# Altium schematic symbol library IC_ADI.SCHLIB: 3169 symbols (part 124 of 181) (continued)
## AD7945ARS-B
designator U?
Single 12-Bit Multiplying Digital-to-Analog Converter, 3.3 V / 5 V, -40 to +85 degC, RS-20, Tube; Generic Part Number: AD7945; PartNumber: AD7945ARS-B; # DAC Outputs: 1; Max V+: 5.5V; Op Pwr Diss: 25礧; Resolution (Bits): 12; Settling Time: 600ns; Single Supply: Yes; DatasheetVersion: Rev.B; PackageVersion: Mar-2003; PackageReference: RS-20; PackageDescription: 20-Lead Shrink Small Outline Package [SSOP]; Supplier Part Number 1: AD7945ARS-B-ND; Supplier Part Number 2: 584-AD7945ARS-B; Packing: Tube; RoHS: N; Mounting Technology: Surface Mount; Code_JEDEC: MO-150AE; ComponentLink1Description: Manufacturer URL; ComponentLink2Description: Datasheet; ComponentLink3Description: Package Specification; ComponentLink4Description: Product URL
footprint SSOP20_0.65 (Footprint not found)
pins: 1 IOUT1 (out) "DAC current output terminal 1.", 2 AGND (power) "This pin connects to the back gates of the current steering switches. The DAC IOUT2 terminal is also connected internally to this point.", 3 DGND (power) "Digital Ground.", 4 DB11 (in) "Digital Data Input.", 5 DB10 (in) "Digital Data Input.", 6 DB9 (in) "Digital Data Input.", 7 DB8 (in) "Digital Data Input.", 8 DB7 (in) "Digital Data Input.", 9 DB6 (in) "Digital Data Input.", 10 DB5 (in) "Digital Data Input.", 11 DB4 (in) "Digital Data Input.", 12 DB3 (in) "Digital Data Input.", 13 DB2 (in) "Digital Data Input.", 14 DB1 (in) "Digital Data Input.", 15 DB0 (in) "Digital Data Input.", 16 ~{CS} (in) "Active Low, Chip Select Input.", 17 ~{WR} (in) "Active Low, Write Input.", 18 VDD (power) "Power supply input. This is nominally +5 V for Normal Mode Operation and +3.3 V to +5 V for Biased Mode Operation.", 19 VREF (in) "DAC reference input.", 20 RFB (in) "DAC feedback resistor pin."

## AD7945ARSZ-B
designator U?
Single 12-Bit Multiplying Digital-to-Analog Converter, 3.3 V / 5 V, 0 to +70 degC, RS-20, Pb-Free, Tube; Generic Part Number: AD7945; PartNumber: AD7945ARSZ-B; # DAC Outputs: 1; Max V+: 5.5V; Op Pwr Diss: 25礧; Resolution (Bits): 12; Settling Time: 600ns; Single Supply: Yes; DatasheetVersion: Rev.B; PackageVersion: Mar-2003; PackageReference: RS-20; PackageDescription: 20-Lead Shrink Small Outline Package [SSOP]; Supplier Part Number 1: AD7945ARSZ-B-ND; Supplier Part Number 2: 584-AD7945ARSZ-B; Packing: Tube; RoHS: Y; Mounting Technology: Surface Mount; Code_JEDEC: MO-150AE; ComponentLink1Description: Manufacturer URL; ComponentLink2Description: Datasheet; ComponentLink3Description: Package Specification; ComponentLink4Description: Product URL
footprint SSOP20_0.65 (Footprint not found)
pins: 1 IOUT1 (out) "DAC current output terminal 1.", 2 AGND (power) "This pin connects to the back gates of the current steering switches. The DAC IOUT2 terminal is also connected internally to this point.", 3 DGND (power) "Digital Ground.", 4 DB11 (in) "Digital Data Input.", 5 DB10 (in) "Digital Data Input.", 6 DB9 (in) "Digital Data Input.", 7 DB8 (in) "Digital Data Input.", 8 DB7 (in) "Digital Data Input.", 9 DB6 (in) "Digital Data Input.", 10 DB5 (in) "Digital Data Input.", 11 DB4 (in) "Digital Data Input.", 12 DB3 (in) "Digital Data Input.", 13 DB2 (in) "Digital Data Input.", 14 DB1 (in) "Digital Data Input.", 15 DB0 (in) "Digital Data Input.", 16 ~{CS} (in) "Active Low, Chip Select Input.", 17 ~{WR} (in) "Active Low, Write Input.", 18 VDD (power) "Power supply input. This is nominally +5 V for Normal Mode Operation and +3.3 V to +5 V for Biased Mode Operation.", 19 VREF (in) "DAC reference input.", 20 RFB (in) "DAC feedback resistor pin."

## AD7945BN
designator U?
Single 12-Bit Multiplying Digital-to-Analog Converter, 3.3 V / 5 V, -40 to +85 degC, N-20, Tube; Generic Part Number: AD7945; PartNumber: AD7945BN; # DAC Outputs: 1; Max V+: 5.5V; Op Pwr Diss: 25礧; Resolution (Bits): 12; Settling Time: 600ns; Single Supply: Yes; DatasheetVersion: Rev.B; PackageVersion: 070706-A; PackageReference: N-20; PackageDescription: 20-Lead Plastic Dual In-Line Package [PDIP] Narrow Body; Supplier Part Number 1: AD7945BN-ND; Supplier Part Number 2: 584-AD7945BN; Packing: Tube; RoHS: N; Mounting Technology: Through Hole; Code_JEDEC: MS-001; ComponentLink1Description: Manufacturer URL; ComponentLink2Description: Datasheet; ComponentLink3Description: Package Specification; ComponentLink4Description: Product URL
footprint DIP20 (Footprint not found)
pins: 1 IOUT1 (out) "DAC current output terminal 1.", 2 AGND (power) "This pin connects to the back gates of the current steering switches. The DAC IOUT2 terminal is also connected internally to this point.", 3 DGND (power) "Digital Ground.", 4 DB11 (in) "Digital Data Input.", 5 DB10 (in) "Digital Data Input.", 6 DB9 (in) "Digital Data Input.", 7 DB8 (in) "Digital Data Input.", 8 DB7 (in) "Digital Data Input.", 9 DB6 (in) "Digital Data Input.", 10 DB5 (in) "Digital Data Input.", 11 DB4 (in) "Digital Data Input.", 12 DB3 (in) "Digital Data Input.", 13 DB2 (in) "Digital Data Input.", 14 DB1 (in) "Digital Data Input.", 15 DB0 (in) "Digital Data Input.", 16 ~{CS} (in) "Active Low, Chip Select Input.", 17 ~{WR} (in) "Active Low, Write Input.", 18 VDD (power) "Power supply input. This is nominally +5 V for Normal Mode Operation and +3.3 V to +5 V for Biased Mode Operation.", 19 VREF (in) "DAC reference input.", 20 RFB (in) "DAC feedback resistor pin."

## AD7945BR
designator U?
Single 12-Bit Multiplying Digital-to-Analog Converter, 3.3 V / 5 V, -40 to +85 degC, RW-20, Tube; Generic Part Number: AD7945; PartNumber: AD7945BR; # DAC Outputs: 1; Max V+: 5.5V; Op Pwr Diss: 25礧; Resolution (Bits): 12; Settling Time: 600ns; Single Supply: Yes; DatasheetVersion: Rev.B; PackageVersion: 060706-A; PackageReference: RW-20; PackageDescription: 20-Lead Standard Small Outline Package [SOIC_W] Wide Body; Supplier Part Number 1: AD7945BR-ND; Supplier Part Number 2: 584-AD7945BR; Packing: Tube; RoHS: N; Mounting Technology: Surface Mount; Code_JEDEC: MS-013-AC; ComponentLink1Description: Manufacturer URL; ComponentLink2Description: Datasheet; ComponentLink3Description: Package Specification; ComponentLink4Description: Product URL
footprint SOIC20W_1.27 (Footprint not found)
pins: 1 IOUT1 (out) "DAC current output terminal 1.", 2 AGND (power) "This pin connects to the back gates of the current steering switches. The DAC IOUT2 terminal is also connected internally to this point.", 3 DGND (power) "Digital Ground.", 4 DB11 (in) "Digital Data Input.", 5 DB10 (in) "Digital Data Input.", 6 DB9 (in) "Digital Data Input.", 7 DB8 (in) "Digital Data Input.", 8 DB7 (in) "Digital Data Input.", 9 DB6 (in) "Digital Data Input.", 10 DB5 (in) "Digital Data Input.", 11 DB4 (in) "Digital Data Input.", 12 DB3 (in) "Digital Data Input.", 13 DB2 (in) "Digital Data Input.", 14 DB1 (in) "Digital Data Input.", 15 DB0 (in) "Digital Data Input.", 16 ~{CS} (in) "Active Low, Chip Select Input.", 17 ~{WR} (in) "Active Low, Write Input.", 18 VDD (power) "Power supply input. This is nominally +5 V for Normal Mode Operation and +3.3 V to +5 V for Biased Mode Operation.", 19 VREF (in) "DAC reference input.", 20 RFB (in) "DAC feedback resistor pin."

## AD7945BRS
designator U?
Single 12-Bit Multiplying Digital-to-Analog Converter, 3.3 V / 5 V, -40 to +85 degC, RS-20, Tube; Generic Part Number: AD7945; PartNumber: AD7945BRS; # DAC Outputs: 1; Max V+: 5.5V; Op Pwr Diss: 25礧; Resolution (Bits): 12; Settling Time: 600ns; Single Supply: Yes; DatasheetVersion: Rev.B; PackageVersion: Mar-2003; PackageReference: RS-20; PackageDescription: 20-Lead Shrink Small Outline Package [SSOP]; Supplier Part Number 1: AD7945BRS-ND; Supplier Part Number 2: 584-AD7945BRS; Packing: Tube; RoHS: N; Mounting Technology: Surface Mount; Code_JEDEC: MO-150AE; ComponentLink1Description: Manufacturer URL; ComponentLink2Description: Datasheet; ComponentLink3Description: Package Specification; ComponentLink4Description: Product URL
footprint SSOP20_0.65 (Footprint not found)
pins: 1 IOUT1 (out) "DAC current output terminal 1.", 2 AGND (power) "This pin connects to the back gates of the current steering switches. The DAC IOUT2 terminal is also connected internally to this point.", 3 DGND (power) "Digital Ground.", 4 DB11 (in) "Digital Data Input.", 5 DB10 (in) "Digital Data Input.", 6 DB9 (in) "Digital Data Input.", 7 DB8 (in) "Digital Data Input.", 8 DB7 (in) "Digital Data Input.", 9 DB6 (in) "Digital Data Input.", 10 DB5 (in) "Digital Data Input.", 11 DB4 (in) "Digital Data Input.", 12 DB3 (in) "Digital Data Input.", 13 DB2 (in) "Digital Data Input.", 14 DB1 (in) "Digital Data Input.", 15 DB0 (in) "Digital Data Input.", 16 ~{CS} (in) "Active Low, Chip Select Input.", 17 ~{WR} (in) "Active Low, Write Input.", 18 VDD (power) "Power supply input. This is nominally +5 V for Normal Mode Operation and +3.3 V to +5 V for Biased Mode Operation.", 19 VREF (in) "DAC reference input.", 20 RFB (in) "DAC feedback resistor pin."

## AD7945BRSZ
designator U?
Single 12-Bit Multiplying Digital-to-Analog Converter, 3.3 V / 5 V, 0 to +70 degC, RS-20, Pb-Free, Tube; Generic Part Number: AD7945; PartNumber: AD7945BRSZ; # DAC Outputs: 1; Max V+: 5.5V; Op Pwr Diss: 25礧; Resolution (Bits): 12; Settling Time: 600ns; Single Supply: Yes; DatasheetVersion: Rev.B; PackageVersion: Mar-2003; PackageReference: RS-20; PackageDescription: 20-Lead Shrink Small Outline Package [SSOP]; Supplier Part Number 1: AD7945BRSZ-ND; Supplier Part Number 2: 2305692; Supplier Part Number 3: 59K6071; Supplier Part Number 4: 584-AD7945BRSZ; Packing: Tube; RoHS: Y; Mounting Technology: Surface Mount; Code_JEDEC: MO-150AE; ComponentLink1Description: Manufacturer URL; ComponentLink2Description: Datasheet; ComponentLink3Description: Package Specification; ComponentLink4Description: Product URL
footprint SSOP20_0.65 (Footprint not found)
pins: 1 IOUT1 (out) "DAC current output terminal 1.", 2 AGND (power) "This pin connects to the back gates of the current steering switches. The DAC IOUT2 terminal is also connected internally to this point.", 3 DGND (power) "Digital Ground.", 4 DB11 (in) "Digital Data Input.", 5 DB10 (in) "Digital Data Input.", 6 DB9 (in) "Digital Data Input.", 7 DB8 (in) "Digital Data Input.", 8 DB7 (in) "Digital Data Input.", 9 DB6 (in) "Digital Data Input.", 10 DB5 (in) "Digital Data Input.", 11 DB4 (in) "Digital Data Input.", 12 DB3 (in) "Digital Data Input.", 13 DB2 (in) "Digital Data Input.", 14 DB1 (in) "Digital Data Input.", 15 DB0 (in) "Digital Data Input.", 16 ~{CS} (in) "Active Low, Chip Select Input.", 17 ~{WR} (in) "Active Low, Write Input.", 18 VDD (power) "Power supply input. This is nominally +5 V for Normal Mode Operation and +3.3 V to +5 V for Biased Mode Operation.", 19 VREF (in) "DAC reference input.", 20 RFB (in) "DAC feedback resistor pin."

## AD7946BRMZ
designator U?
Single 14-Bit PulSAR Analog-to-Digital Converter with Serial, SPI Interface, 500KSPS, -40 to +85 degC, RM-10, Pb-Free, Tube; Generic Part Number: AD7946; PartNumber: AD7946BRMZ; Resolution (Bits): 14; Channels: 1; Throughput Rate (SPS): 500K; Interface: Ser, SPI; DatasheetVersion: Rev.A; PackageVersion: May-2005; PackageReference: RM-10; PackageDescription: 10-Lead Mini Small Outline Package [MSOP]; Supplier Part Number 1: AD7946BRMZ-ND; Supplier Part Number 2: 1438865; Supplier Part Number 3: 15P0902; Supplier Part Number 4: 584-AD7946BRMZ; RoHS: Y; Packing: Tube; Mounting Technology: Surface Mount; ComponentLink1Description: Manufacturer URL; ComponentLink2Description: Datasheet; ComponentLink3Description: Package Specification; ComponentLink4Description: Product URL
footprint VSSOP10_0.5 (Footprint not found)
pins: 1 REF (in) "Reference Input Voltage. The REF range is from 0.5 V to VDD, and is referred to the GND pin. This pin should be decoupled closely to the pin with a 10 uF capacitor.", 2 VDD (power) "Power Supply.", 3 IN+ (in) "Analog Input. It is referred to IN-. The voltage range, that is, the difference between IN+ and IN-, is 0 V to REF.", 4 IN- (in) "Analog Input Ground Sense. Connect to the analog ground plane or to a remote sense ground.", 5 GND (power) "Power Supply Ground.", 6 CNV (in) "Convert Input. This input has multiple functions. On its leading edge, it initiates the conversions and selects the interface mode, chain, or C\S\. In C\S\ mode, it enables the SDO pin when low. In chain mode, the data (See Datasheet)", 7 SDO (hiz) "Serial Data Output. The conversion result is output on this pin. It is synchronized to SCK.", 8 SCK (in) "Serial Data Clock Input. When the part is selected, the conversion result is shifted out by this clock.", 9 SDI (in) "Serial Data Input. This input provides multiple features. It selects the interface mode of the ADC as follows: Chain mode is selected if SDI is low during the CNV rising edge. In this mode, SDI is used as a data input to (See Datasheet)", 10 VIO (power) "Input/Output Interface Digital Power. Nominally at the same supply as the host interface (1.8 V, 2.5 V, 3 V, or 5 V)."

## AD7948ARSZ-B
designator U?
Single 12-Bit Multiplying Digital-to-Analog Converter, 3.3 V / 5 V, -40 to +85 degC, RS-20, Pb-Free, Tube; Generic Part Number: AD7948; PartNumber: AD7948ARSZ-B; # DAC Outputs: 1; Max V+: 5.5V; Op Pwr Diss: 25礧; Resolution (Bits): 12; Settling Time: 600ns; Single Supply: Yes; DatasheetVersion: Rev.B; PackageVersion: Mar-2003; PackageReference: RS-20; PackageDescription: 20-Lead Shrink Small Outline Package [SSOP]; Supplier Part Number 1: AD7948ARSZ-B-ND; Supplier Part Number 2: 584-AD7948ARSZ-B; Packing: Tube; RoHS: Y; Mounting Technology: Surface Mount; Code_JEDEC: MO-150AE; ComponentLink1Description: Manufacturer URL; ComponentLink2Description: Datasheet; ComponentLink3Description: Package Specification; ComponentLink4Description: Product URL
footprint SSOP20_0.65 (Footprint not found)
pins: 1 IOUT1 (out) "DAC current output terminal 1. Normally terminated at the virtual ground of output amplifier.", 2 AGND (power) "Analog Ground Pin. This pin connects to the back gates of the current steering switches. The DAC IOUT2 terminal is also connected internally to this point.", 3 DGND (power) "Digital Ground Pin.", 4 ~{CSMSB} (in) "Chip Select Most Significant Byte. Active Low Input. Used in combination with W\R\ to load external data into the input register or in combination with L\D\A\C\ and W\R\ to load external data into both input and DAC (See Datasheet)", 5 DF/~{DOR} (in) "Data Format/Data Override. When this input is low, data in the DAC register is forced to one of two override codes selected by CTRL. When the override signal is removed, the DAC output returns to reflect the value in the DAC (See Datasheet)", 6 CTRL (in) "Control Input. See DF/D\O\R\ description.", 7 DB7 (MSB) (in) "Digital Data Input", 8 DB6 (in) "Digital Data Input", 9 DB5 (in) "Digital Data Input", 10 DB4 (in) "Digital Data Input", 11 DB3 (in) "Digital Data Input", 12 DB2 (in) "Digital Data Input", 13 DB1 (in) "Digital Data Input", 14 DB0 (LSB) (in) "Digital Data Input", 15 ~{LDAC} (in) "Load DAC input, active low. This signal, in combination with others, is used to load the DAC register from either the input register or the external data bus.", 16 ~{CSLSB} (in) "Chip Select Least Significant (LS) Byte. Active Low Input. Used in combination with W\R\ to load external data into the input register or in combination with W\R\ and L\D\A\C\ to load external data into both input and DAC (See Datasheet)", 17 ~{WR} (in) "Write input, active low. This active low signal, in combination with others is used in loading external data into the AD7948 input register and in transferring data from the input register to the DAC register.", 18 VDD (power) "Power supply input. This is nominally +5 V for Normal Mode Operation and +3.3 V to +5 V for Biased Mode Operation.", 19 VREF (in) "DAC reference input.", 20 RFB (in) "DAC feedback resistor pin."

## AD7948BN
designator U?
Single 12-Bit Multiplying Digital-to-Analog Converter, 3.3 V / 5 V, -40 to +85 degC, N-20, Tube; Generic Part Number: AD7948; PartNumber: AD7948BN; # DAC Outputs: 1; Max V+: 5.5V; Op Pwr Diss: 25礧; Resolution (Bits): 12; Settling Time: 600ns; Single Supply: Yes; DatasheetVersion: Rev.B; PackageVersion: 070706-A; PackageReference: N-20; PackageDescription: 20-Lead Plastic Dual In-Line Package [PDIP] Narrow Body; Supplier Part Number 1: AD7948BN-ND; Supplier Part Number 2: 584-AD7948BN; Packing: Tube; RoHS: N; Mounting Technology: Through Hole; Code_JEDEC: MS-001; ComponentLink1Description: Manufacturer URL; ComponentLink2Description: Datasheet; ComponentLink3Description: Package Specification; ComponentLink4Description: Product URL
footprint DIP20 (Footprint not found)
pins: 1 IOUT1 (out) "DAC current output terminal 1. Normally terminated at the virtual ground of output amplifier.", 2 AGND (power) "Analog Ground Pin. This pin connects to the back gates of the current steering switches. The DAC IOUT2 terminal is also connected internally to this point.", 3 DGND (power) "Digital Ground Pin.", 4 ~{CSMSB} (in) "Chip Select Most Significant Byte. Active Low Input. Used in combination with W\R\ to load external data into the input register or in combination with L\D\A\C\ and W\R\ to load external data into both input and DAC (See Datasheet)", 5 DF/~{DOR} (in) "Data Format/Data Override. When this input is low, data in the DAC register is forced to one of two override codes selected by CTRL. When the override signal is removed, the DAC output returns to reflect the value in the DAC (See Datasheet)", 6 CTRL (in) "Control Input. See DF/D\O\R\ description.", 7 DB7 (MSB) (in) "Digital Data Input", 8 DB6 (in) "Digital Data Input", 9 DB5 (in) "Digital Data Input", 10 DB4 (in) "Digital Data Input", 11 DB3 (in) "Digital Data Input", 12 DB2 (in) "Digital Data Input", 13 DB1 (in) "Digital Data Input", 14 DB0 (LSB) (in) "Digital Data Input", 15 ~{LDAC} (in) "Load DAC input, active low. This signal, in combination with others, is used to load the DAC register from either the input register or the external data bus.", 16 ~{CSLSB} (in) "Chip Select Least Significant (LS) Byte. Active Low Input. Used in combination with W\R\ to load external data into the input register or in combination with W\R\ and L\D\A\C\ to load external data into both input and DAC (See Datasheet)", 17 ~{WR} (in) "Write input, active low. This active low signal, in combination with others is used in loading external data into the AD7948 input register and in transferring data from the input register to the DAC register.", 18 VDD (power) "Power supply input. This is nominally +5 V for Normal Mode Operation and +3.3 V to +5 V for Biased Mode Operation.", 19 VREF (in) "DAC reference input.", 20 RFB (in) "DAC feedback resistor pin."

## AD7948BRSZ
designator U?
Single 12-Bit Multiplying Digital-to-Analog Converter, 3.3 V / 5 V, -40 to +85 degC, RS-20, Pb-Free, Tube; Generic Part Number: AD7948; PartNumber: AD7948BRSZ; # DAC Outputs: 1; Max V+: 5.5V; Op Pwr Diss: 25礧; Resolution (Bits): 12; Settling Time: 600ns; Single Supply: Yes; DatasheetVersion: Rev.B; PackageVersion: Mar-2003; PackageReference: RS-20; PackageDescription: 20-Lead Shrink Small Outline Package [SSOP]; Supplier Part Number 1: AD7948BRSZ-ND; Supplier Part Number 2: 584-AD7948BRSZ; Packing: Tube; RoHS: Y; Mounting Technology: Surface Mount; Code_JEDEC: MO-150AE; ComponentLink1Description: Manufacturer URL; ComponentLink2Description: Datasheet; ComponentLink3Description: Package Specification; ComponentLink4Description: Product URL
footprint SSOP20_0.65 (Footprint not found)
pins: 1 IOUT1 (out) "DAC current output terminal 1. Normally terminated at the virtual ground of output amplifier.", 2 AGND (power) "Analog Ground Pin. This pin connects to the back gates of the current steering switches. The DAC IOUT2 terminal is also connected internally to this point.", 3 DGND (power) "Digital Ground Pin.", 4 ~{CSMSB} (in) "Chip Select Most Significant Byte. Active Low Input. Used in combination with W\R\ to load external data into the input register or in combination with L\D\A\C\ and W\R\ to load external data into both input and DAC (See Datasheet)", 5 DF/~{DOR} (in) "Data Format/Data Override. When this input is low, data in the DAC register is forced to one of two override codes selected by CTRL. When the override signal is removed, the DAC output returns to reflect the value in the DAC (See Datasheet)", 6 CTRL (in) "Control Input. See DF/D\O\R\ description.", 7 DB7 (MSB) (in) "Digital Data Input", 8 DB6 (in) "Digital Data Input", 9 DB5 (in) "Digital Data Input", 10 DB4 (in) "Digital Data Input", 11 DB3 (in) "Digital Data Input", 12 DB2 (in) "Digital Data Input", 13 DB1 (in) "Digital Data Input", 14 DB0 (LSB) (in) "Digital Data Input", 15 ~{LDAC} (in) "Load DAC input, active low. This signal, in combination with others, is used to load the DAC register from either the input register or the external data bus.", 16 ~{CSLSB} (in) "Chip Select Least Significant (LS) Byte. Active Low Input. Used in combination with W\R\ to load external data into the input register or in combination with W\R\ and L\D\A\C\ to load external data into both input and DAC (See Datasheet)", 17 ~{WR} (in) "Write input, active low. This active low signal, in combination with others is used in loading external data into the AD7948 input register and in transferring data from the input register to the DAC register.", 18 VDD (power) "Power supply input. This is nominally +5 V for Normal Mode Operation and +3.3 V to +5 V for Biased Mode Operation.", 19 VREF (in) "DAC reference input.", 20 RFB (in) "DAC feedback resistor pin."

## AD7949BCPZ
designator U?
Octal 14-Bit PulSAR Analog-to-Digital Converter with Serial, SPI Interface, 250KSPS, -40 to +85 degC, CP-20-4, Pb-Free, Tray; Generic Part Number: AD7949; PartNumber: AD7949BCPZ; Resolution (Bits): 14; Channels: 8; Throughput Rate (SPS): 250K; Interface: Ser, SPI; DatasheetVersion: Rev.D; PackageVersion: 012508-B; PackageReference: CP-20-4; PackageDescription: 20-Lead Lead Frame Chip Scale Package [LFCSP_VQ] 4 x 4 mm Body, Very Thin Quad; Supplier Part Number 1: AD7949BCPZ-ND; Supplier Part Number 2: 2102529; Supplier Part Number 3: 11N8865; Supplier Part Number 4: 584-AD7949BCPZ; RoHS: Y; Packing: Tray; Mounting Technology: Surface Mount; Code_JEDEC: MO-220-VGGD-1; ComponentLink1Description: Manufacturer URL; ComponentLink2Description: Datasheet; ComponentLink3Description: Package Specification; ComponentLink4Description: Product URL
footprint QFN20_0.5-PAD(4X4) (Footprint not found)
pins: 1 VDD (power) "Power Supply. Nominally 2.5 V to 5.5 V when using an external reference and decoupled with 10 uF and 100 nF capacitors.When using the internal reference for 2.5 V output, the minimum should be 3.0 V.When using the internal (See Datasheet)", 2 REF (io) "Reference Input/Output. See the Voltage Reference Output/Input section. When the internal reference is enabled, this pin produces a selectable system reference = 2.5 V or 4.096 V. When the internal reference is disabled and (See Datasheet)", 3 REFIN (io) "Internal Reference Output/Reference Buffer Input. See the Voltage Reference Output/Input section.When using the internal reference, the internal unbuffered reference voltage is present and needs decoupling with a 0.1 uF (See Datasheet)", 4 GND (power) "Power Supply Ground.", 5 GND (power) "Power Supply Ground.", 6 IN4 (in) "Channel 4 Analog Inputs.", 7 IN5 (in) "Channel 5 Analog Inputs.", 8 IN6 (in) "Channel 6 Analog Inputs.", 9 IN7 (in) "Channel 7 Analog Inputs.", 10 COM (in) "Common Channel Input. All input channels, IN[7:0], can be referenced to a common-mode point of 0 V or VREF/2 V.", 11 CNV (in) "Convert Input. On the rising edge, CNV initiates the conversion. During conversion, if CNV is held high, the busy indictor is enabled.", 12 DIN (in) "Data Input. This input is used for writing to the 14-bit configuration register. The configuration register can be written to during and after conversion.", 13 SCK (in) "Serial Data Clock Input. This input is used to clock out the data on SDO and clock in data on DIN in an MSB first fashion.", 14 SDO (hiz) "Serial Data Output. The conversion result is output on this pin, synchronized to SCK. In unipolar modes, conversion results are straight binary; in bipolar modes, conversion results are twos complement.", 15 VIO (power) "Input/Output Interface Digital Power. Nominally at the same supply as the host interface (1.8 V, 2.5 V, 3 V, or 5 V).", 16 IN0 (in) "Channel 0 Analog Inputs.", 17 IN1 (in) "Channel 1 Analog Inputs.", 18 IN2 (in) "Channel 2 Analog Inputs.", 19 IN3 (in) "Channel 3 Analog Inputs.", 20 VDD (power) "Power Supply. Nominally 2.5 V to 5.5 V when using an external reference and decoupled with 10 uF and 100 nF capacitors.When using the internal reference for 2.5 V output, the minimum should be 3.0 V.When using the internal (See Datasheet)", 21 EP "The exposed pad is not connected internally. For increased reliability of the solder joints, it is recommended that the pad be soldered to the system ground plane."

## AD7949SCPZ-EP-RL7
designator U?
Octal 14-Bit PulSAR Analog-to-Digital Converter with Serial, SPI Interface, 250KSPS, -55 to +125 degC , CP-20-4, Pb-Free, Reel; Generic Part Number: AD7949; PartNumber: AD7949SCPZ-EP-RL7; Resolution (Bits): 14; Channels: 8; Throughput Rate (SPS): 250K; Interface: Ser, SPI; DatasheetVersion: Rev.0; PackageVersion: 012508-B; PackageReference: CP-20-4; PackageDescription: 20-Lead Lead Frame Chip Scale Package [LFCSP_VQ] 4 x 4 mm Body, Very Thin Quad; Supplier Part Number 1: AD7949SCPZ-EP-RL7TR-ND; Supplier Part Number 2: AD7949SCPZ-EP-RL7CT-ND; Supplier Part Number 3: AD7949SCPZ-EP-RL7DKR-ND; Supplier Part Number 4: 584-AD7949SCPZ-EP-R7; RoHS: Y; Packing: Reel; Mounting Technology: Surface Mount; Code_JEDEC: MO-220-VGGD-1; ComponentLink1Description: Manufacturer URL; ComponentLink2Description: Datasheet; ComponentLink3Description: Package Specification; ComponentLink4Description: Product URL
footprint QFN20_0.5-PAD(4X4) (Footprint not found)
pins: 1 VDD (power) "Power Supply. Nominally 2.5 V to 5.5 V when using an external reference and decoupled with 10 uF and 100 nF capacitors.When using the internal reference for 2.5 V output, the minimum should be 3.0 V.When using the internal (See Datasheet)", 2 REF (io) "Reference Input/Output. See the Voltage Reference Output/Input section. When the internal reference is enabled, this pin produces a selectable system reference = 2.5 V or 4.096 V. When the internal reference is disabled and (See Datasheet)", 3 REFIN (io) "Internal Reference Output/Reference Buffer Input. See the Voltage Reference Output/Input section.When using the internal reference, the internal unbuffered reference voltage is present and needs decoupling with a 0.1 uF (See Datasheet)", 4 GND (power) "Power Supply Ground.", 5 GND (power) "Power Supply Ground.", 6 IN4 (in) "Channel 4 Analog Inputs.", 7 IN5 (in) "Channel 5 Analog Inputs.", 8 IN6 (in) "Channel 6 Analog Inputs.", 9 IN7 (in) "Channel 7 Analog Inputs.", 10 COM (in) "Common Channel Input. All input channels, IN[7:0], can be referenced to a common-mode point of 0 V or VREF/2 V.", 11 CNV (in) "Convert Input. On the rising edge, CNV initiates the conversion. During conversion, if CNV is held high, the busy indictor is enabled.", 12 DIN (in) "Data Input. This input is used for writing to the 14-bit configuration register. The configuration register can be written to during and after conversion.", 13 SCK (in) "Serial Data Clock Input. This input is used to clock out the data on SDO and clock in data on DIN in an MSB first fashion.", 14 SDO (hiz) "Serial Data Output. The conversion result is output on this pin, synchronized to SCK. In unipolar modes, conversion results are straight binary; in bipolar modes, conversion results are twos complement.", 15 VIO (power) "Input/Output Interface Digital Power. Nominally at the same supply as the host interface (1.8 V, 2.5 V, 3 V, or 5 V).", 16 IN0 (in) "Channel 0 Analog Inputs.", 17 IN1 (in) "Channel 1 Analog Inputs.", 18 IN2 (in) "Channel 2 Analog Inputs.", 19 IN3 (in) "Channel 3 Analog Inputs.", 20 VDD (power) "Power Supply. Nominally 2.5 V to 5.5 V when using an external reference and decoupled with 10 uF and 100 nF capacitors.When using the internal reference for 2.5 V output, the minimum should be 3.0 V.When using the internal (See Datasheet)", 21 EP "The exposed pad is not connected internally. For increased reliability of the solder joints, it is recommended that the pad be soldered to the system ground plane."

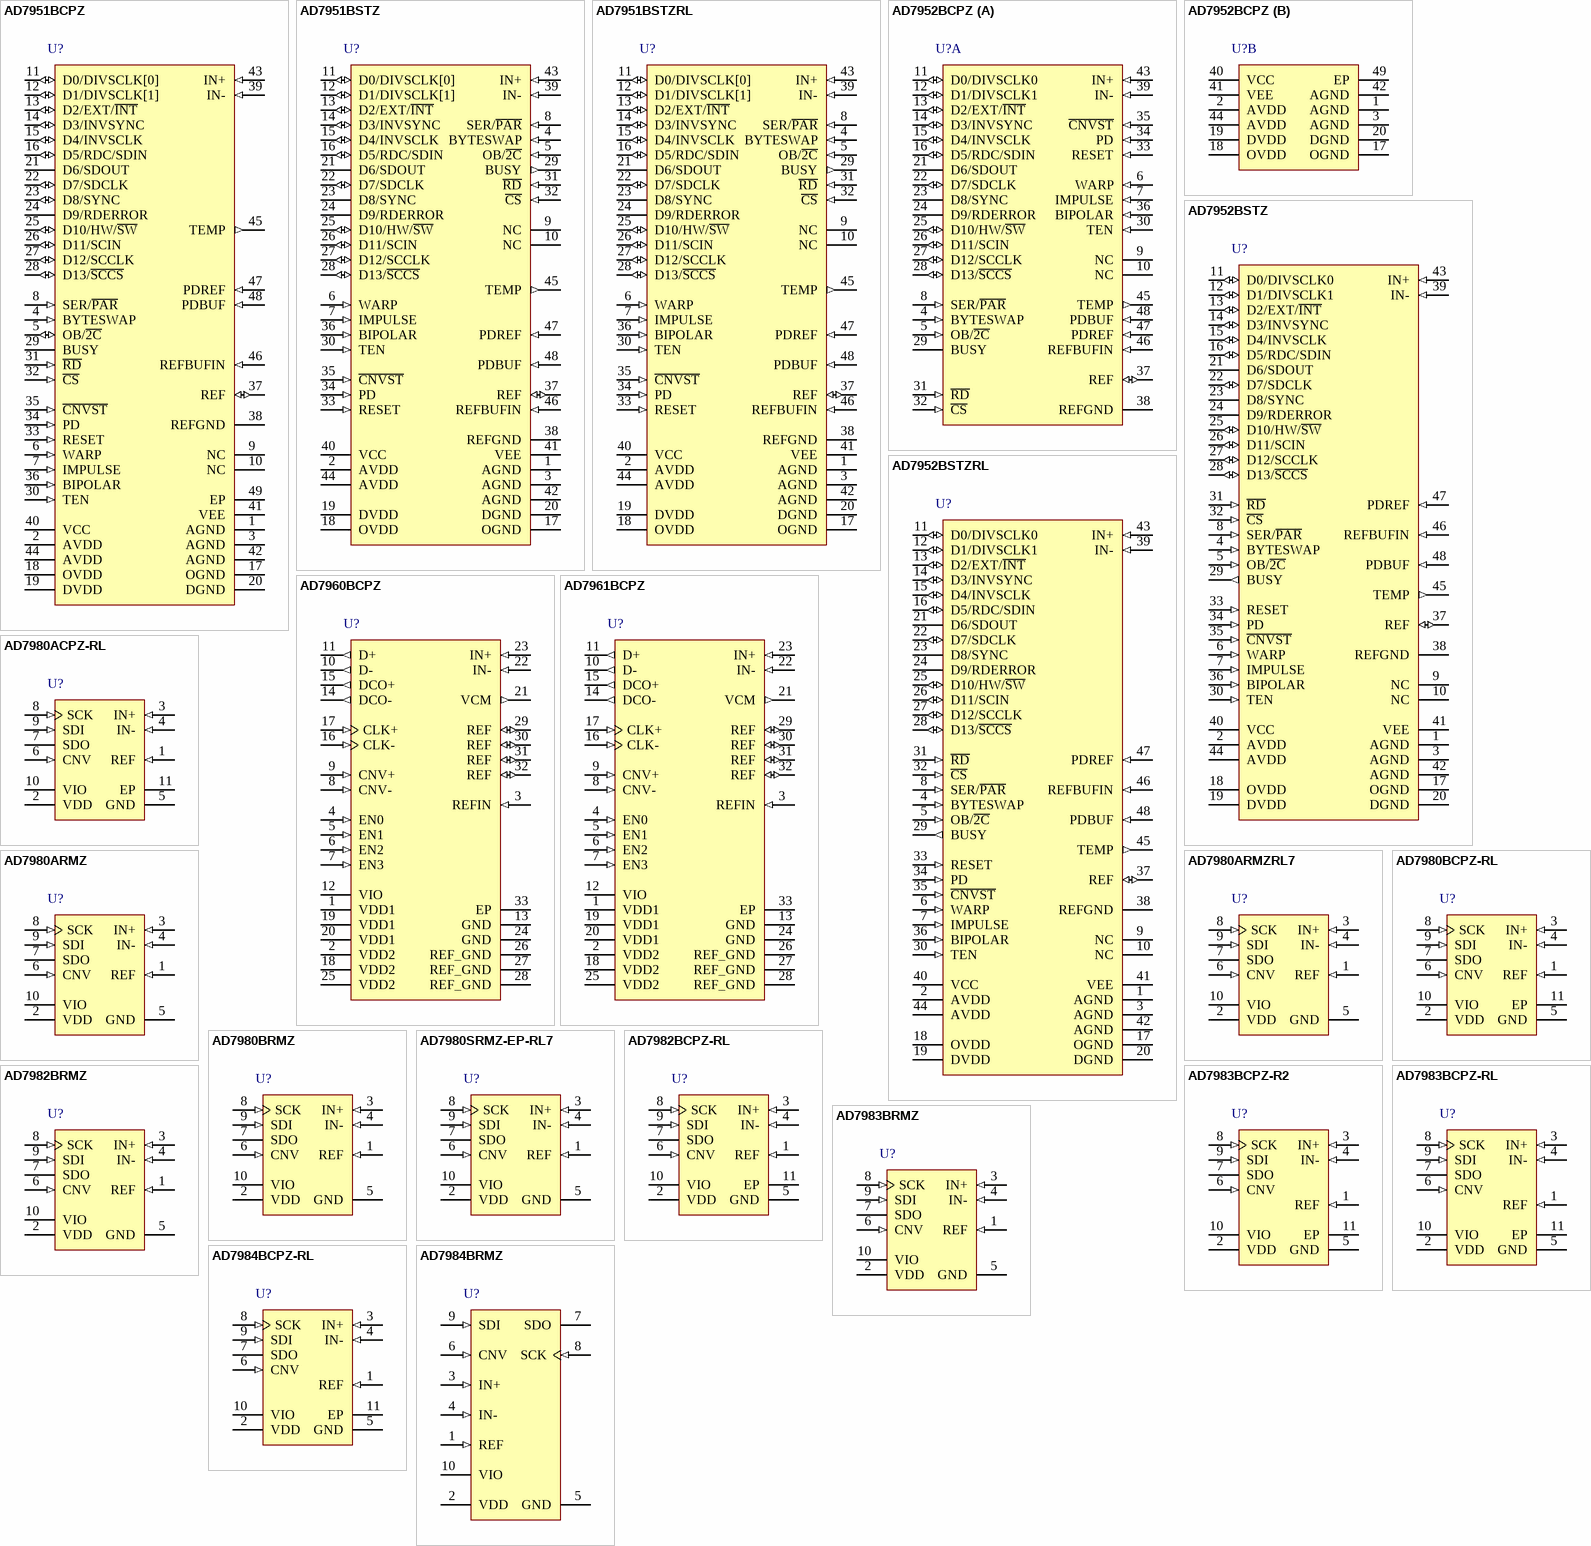
[diagram p88: symbols AD7951BCPZ to AD7984BRMZ]